# Altium footprint library VESC_MotorController.PcbLib: 78 footprints (part 3 of 5)
Each footprint in its own frame and in the unit in brackets; x right, y up, seen from the top. Pads: shape width x height; smd on the part's side, far side on the other; paste and mask are expansions set on the pad; w line width, h text height; cw(c..) or ccw(c..) is an arc to the next point about the centre after c.
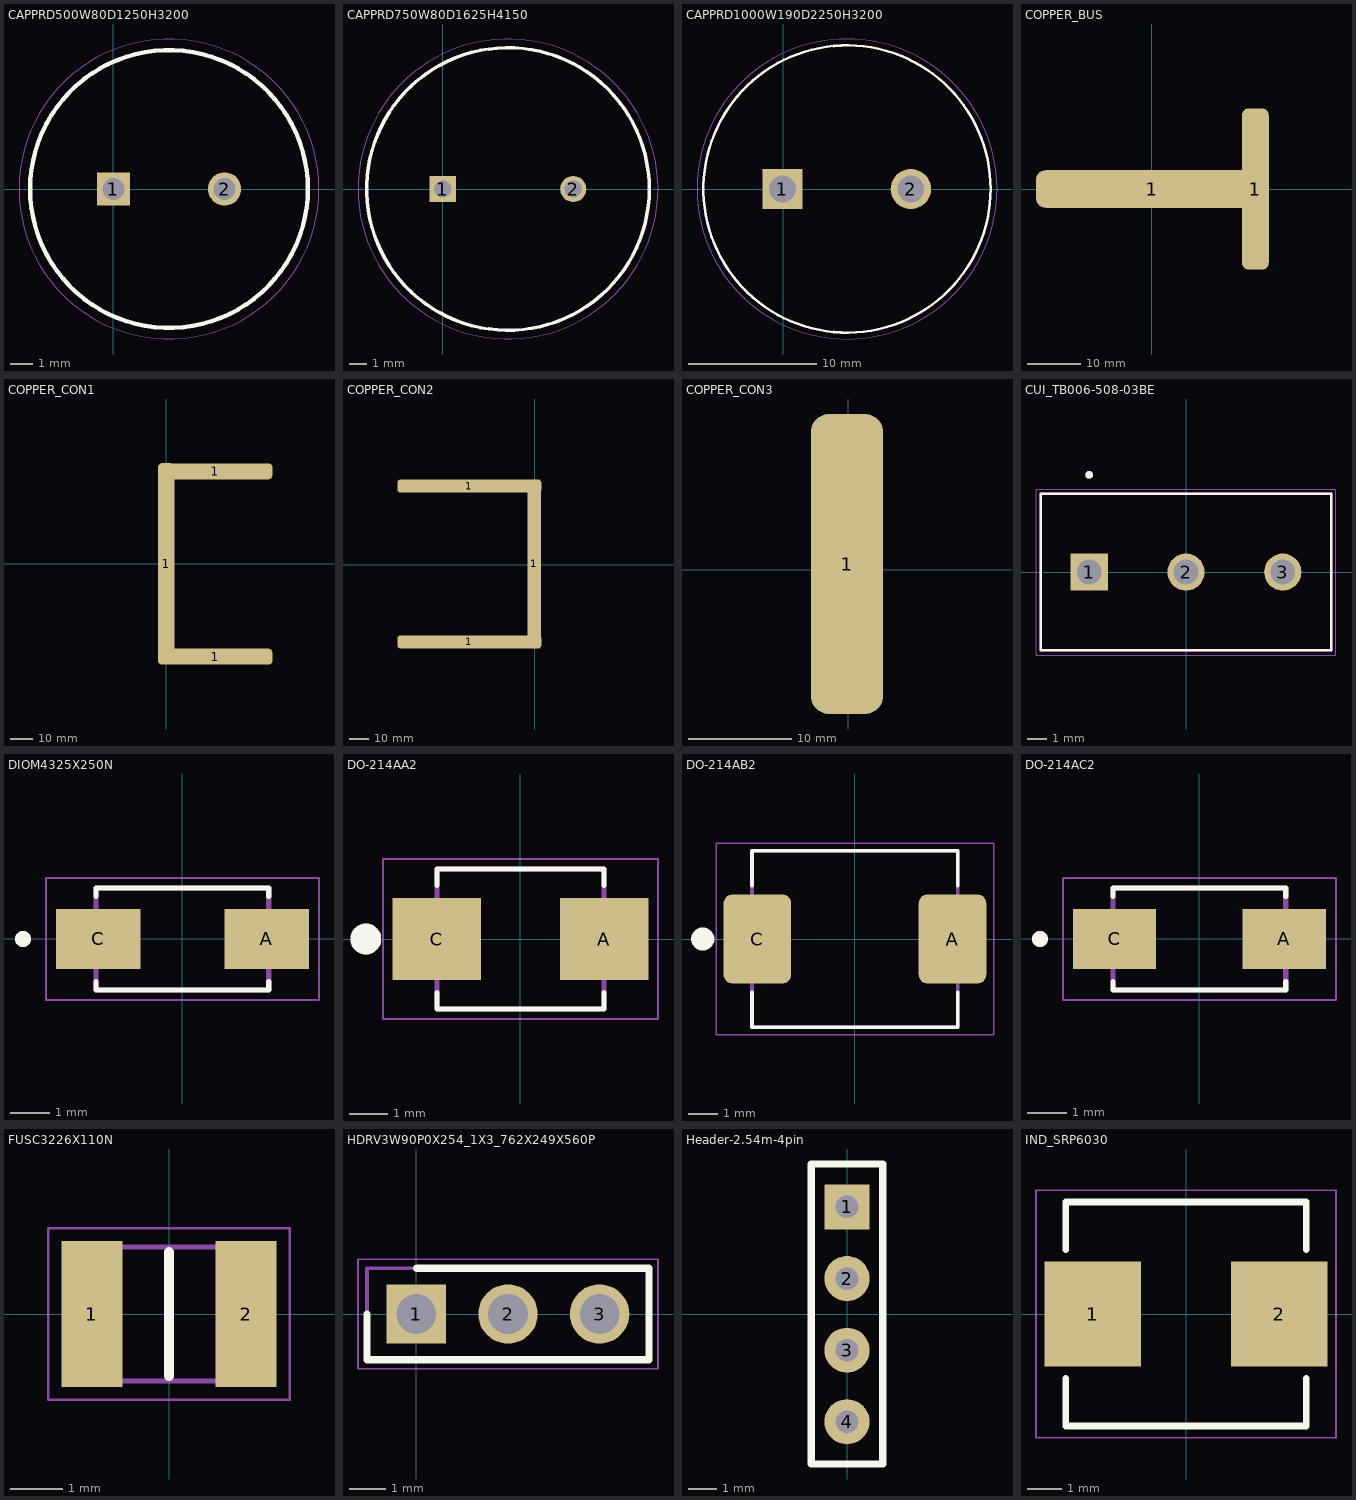
[diagram p2: the footprints below, top view; thin cyan lines are the x and y axes]

## CAPPRD500W80D1250H3200 [mm]
pads (2):
  rect 1.5x1.5 hole 1: 1(0,0)
  round 1.5 hole 1: 2(5,0)
Top Overlay:
  circle w0.2: c2.5,0 r6.25
Mechanical 15:
  circle w0.1: c2.5,0 r6.25
Mechanical 20:
  circle w0.05: c2.5,0 r6.75
3D body "EEU-FS1K471L.STEP": height 17, standoff -30, extent -3.71,-6.25 8.79,6.25

## CAPPRD750W80D1625H4150 [mm]
pads (2):
  rect 1.5x1.5 hole 1: 1(0,0)
  round 1.5 hole 1: 2(7.5,0)
Top Overlay:
  circle w0.2: c3.75,0 r8.125
Mechanical 15:
  circle w0.1: c3.75,0 r8.125
Mechanical 20:
  circle w0.05: c3.75,0 r8.625
3D body "UCY2C471MHD6.stp": height 41.5, standoff -10, extent -4.5,-8.25 12,8.25

## CAPPRD1000W190D2250H3200 [mm]
pads (2):
  rect 3.15x3.15 hole 2.1: 1(-0.064,0)
  round 3.15 hole 2.1: 2(10,0)
Top Overlay:
  circle w0.2: c5,0 r11.25
Mechanical 15:
  circle w0.1: c5,0 r11.25
Mechanical 20:
  circle w0.05: c5,0 r11.75
3D body "SLP471M160A3P3.stp": height 32, standoff -10, extent -6.5,-11.496 16.5,11.496

## COPPER_BUS [mm]
height 0.78
pads (2):
  rrect50% 43.2x7 smd: 1(0.064,0)
  rrect50% 5x30 smd: 1(19.241,0)
Top Assembly:
  text "1" at -16.002,-58.61 h1.52
  text "1" at -12.128,-34.099 h1.52
3D body "Bus4.STEP": height 5, standoff 0, extent -22.156,-15.637 21.844,15.764

## COPPER_CON1 [mm]
height 0.78
pads (3):
  rrect50% 7x88 smd: 1(0,0)
  rrect50% 50x7 smd: 1(21.399,-40.513) 1(21.399,40.45)
Top Assembly:
  text "1" at -16.002,-58.61 h1.52
  text "1" at -12.128,-34.099 h1.52
3D body "Bus1.STEP": height 15, standoff 0, extent -3.635,-44 53.366,44

## COPPER_CON2 [mm]
height 0.78
pads (3):
  rrect50% 76x7 smd: 1(-34.417,-40.64) 1(-34.417,41.593)
  rrect50% 7x89 smd: 1(-0.127,0.572)
Top Assembly:
  text "1" at -16.002,-58.61 h1.52
3D body "Bus2.STEP": height 15, standoff 0, extent -74.493,-44.055 3.508,44.944

## COPPER_CON3 [mm]
height 0.78
pads (1):
  rrect50% 7x29 smd: 1(-0.127,0.572)
Top Assembly:
  text "1" at -16.002,-58.61 h1.52
3D body "Bus3.STEP": height 15, standoff 0, extent -3.571,-13.865 3.429,15.135

## CUI_TB006-508-03BE [mm]
pads (3):
  rect 1.95x1.95 / inner round 1.95 / far side rect 1.95x1.95 hole 1.3: 1(-5.08,0)
  round 1.95 hole 1.3: 2(0,0) 3(5.08,0)
Top Overlay:
  circle w0.2: c-5.08,5.1 r0.1
  lines w0.127: -7.62,-4.1 7.62,-4.1 7.62,4.1 -7.62,4.1 -7.62,-4.1
Mechanical 13:
  circle w0.2: c-5.08,5.1 r0.1
  lines w0.127: -7.62,-4.1 7.62,-4.1 7.62,4.1 -7.62,4.1 -7.62,-4.1
Mechanical 15:
  lines w0.05: -7.87,-4.35 -7.87,4.35 7.87,4.35 7.87,-4.35 -7.87,-4.35
3D body "step_temp.STEP": height 10, standoff -3.8, extent -8.12,-4.1 7.62,4.1

## DIOM4325X250N [mm]
pads (2):
  rect 2.12x1.5 smd: A(2.115,0) C(-2.115,0)
Top Overlay:
  circle w0.2: c-4,0 r0.1
  lines w0.127: -2.165,-1.07 -2.165,-1.28 2.165,-1.28 2.165,-1.07 ; -2.165,1.07 -2.165,1.28 2.165,1.28 2.165,1.07
Mechanical 13:
  circle w0.2: c-4,0 r0.1
  lines w0.127: -2.165,-1.28 2.165,-1.28 2.165,1.28 -2.165,1.28 -2.165,-1.28
Mechanical 15:
  lines w0.05: -3.425,-1.53 3.425,-1.53 3.425,1.53 -3.425,1.53 -3.425,-1.53
3D body "step_temp.STEP": height 2.5, standoff 0, extent -2.57,-1.28 2.57,1.28

## DO-214AA2 [mm]
pads (2):
  rect 2.28x2.12 smd: A(2.165,0) C(-2.165,0)
Top Overlay:
  circle w0.4: c-4,0 r0.2
  lines w0.127: -2.163,-1.38 -2.163,-1.813 2.163,-1.813 2.163,-1.38 ; -2.163,1.38 -2.163,1.813 2.163,1.813 2.163,1.38
Mechanical 13:
  circle w0.4: c-4,0 r0.2
  lines w0.127: -2.163,-1.813 2.163,-1.813 2.163,1.813 -2.163,1.813 -2.163,-1.813
Mechanical 15:
  lines w0.05: -3.555,-2.063 3.555,-2.063 3.555,2.063 -3.555,2.063 -3.555,-2.063
3D body "step_temp.STEP": height 2.46, standoff 0, extent -2.718,-1.778 2.718,1.778

## DO-214AB2 [mm]
pads (2):
  rrect25% 2.33x3.07 smd: A(3.365,0) C(-3.365,0)
Top Overlay:
  circle w0.4: c-5.25,0 r0.2
  lines w0.127: -3.55,-1.849 -3.55,-3.05 3.55,-3.05 3.55,-1.849 ; -3.55,1.849 -3.55,3.05 3.55,3.05 3.55,1.849
Mechanical 13:
  lines w0.127: -3.55,-3.05 -3.55,3.05 3.55,3.05 3.55,-3.05 -3.55,-3.05
Mechanical 15:
  lines w0.05: -4.78,-3.3 4.78,-3.3 4.78,3.3 -4.78,3.3 -4.78,-3.3
3D body "B540C-13-F.stp": height 2.5, standoff 0, extent -3.97,-2.952 3.97,2.953

## DO-214AC2 [mm]
height 2.5
pads (2):
  rect 2.09x1.5 smd: A(2.13,0) C(-2.13,0)
Top Overlay:
  circle w0.2: c-4,0 r0.1
  lines w0.127: -2.165,-1.07 -2.165,-1.28 2.165,-1.28 2.165,-1.07 ; -2.165,1.07 -2.165,1.28 2.165,1.28 2.165,1.07
Mechanical 13:
  circle w0.2: c-4,0 r0.1
  lines w0.127: -2.165,-1.28 2.165,-1.28 2.165,1.28 -2.165,1.28 -2.165,-1.28
Mechanical 15:
  lines w0.05: -3.425,-1.53 3.425,-1.53 3.425,1.53 -3.425,1.53 -3.425,-1.53
3D body "step_temp.STEP": height 2.5, standoff 0, extent -2.57,-1.28 2.57,1.28

## FUSC3226X110N [mm]
pads (2):
  rect 1.18x2.81 smd: 1(-1.485,0) 2(1.485,0)
Top Overlay:
  lines w0.2: 0,-1.188 0,1.188
Mechanical 15:
  lines w0.1: -1.608,-1.288 1.608,-1.288 1.608,1.288 -1.608,1.288 -1.608,-1.288
Mechanical 20:
  lines w0.05: -2.325,-1.655 2.325,-1.655 2.325,1.655 -2.325,1.655 -2.325,-1.655
3D body "srr1210-680m.stp": height 6, standoff -6, extent -6.254,-1.714 5.746,8.286

## HDRV3W90P0X254_1X3_762X249X560P [mm]
pads (3):
  rect 1.65x1.65 / inner round 1.65 / far side rect 1.65x1.65 hole 1.1: 1(0,0)
  round 1.65 hole 1.1: 2(2.54,0) 3(5.08,0)
Top Overlay:
  lines w0.2: -1.37,0 -1.37,-1.27 6.45,-1.27 6.45,1.27 0,1.27
Mechanical 15:
  lines w0.1: -1.37,-1.27 -1.37,1.27 6.45,1.27 6.45,-1.27 -1.37,-1.27
Mechanical 20:
  lines w0.05: -1.62,-1.52 -1.62,1.52 6.7,1.52 6.7,-1.52 -1.62,-1.52

## Header-2.54m-4pin [mm]
pads (4):
  rect 1.6x1.6 hole 0.8: 1(0,3.81)
  round 1.6 hole 0.8: 2(0,1.27) 3(0,-1.27) 4(0,-3.81)
Top Overlay:
  lines w0.254: -1.27,-5.31 -1.27,5.334 1.27,5.334 1.27,-5.31 -1.27,-5.31

## IND_SRP6030 [mm]
pads (2):
  rect 2.85x3.1 smd: 1(-2.75,0) 2(2.75,0)
Top Overlay:
  lines w0.2: -3.55,-1.905 -3.55,-3.3 3.55,-3.3 ; -3.55,1.905 -3.55,3.3 ; -3.55,3.3 3.55,3.3 ; 3.55,1.905 3.55,3.3 ; 3.55,-3.3 3.55,-1.905
Mechanical 20:
  lines w0.05: -4.425,-3.65 4.425,-3.65 4.425,3.65 -4.425,3.65 -4.425,-3.65
3D body "SRP6030WA-220M.stp": height 3, standoff 0, extent -3.55,-3.3 3.55,3.3